# Altium footprint library Connector_PinHeader_1.00mm.PcbLib: 278 footprints (part 2 of 18)
Each footprint in its own frame and in the unit in brackets; x right, y up, seen from the top. Pads: shape width x height; smd on the part's side, far side on the other; paste and mask are expansions set on the pad; w line width, h text height; cw(c..) or ccw(c..) is an arc to the next point about the centre after c.
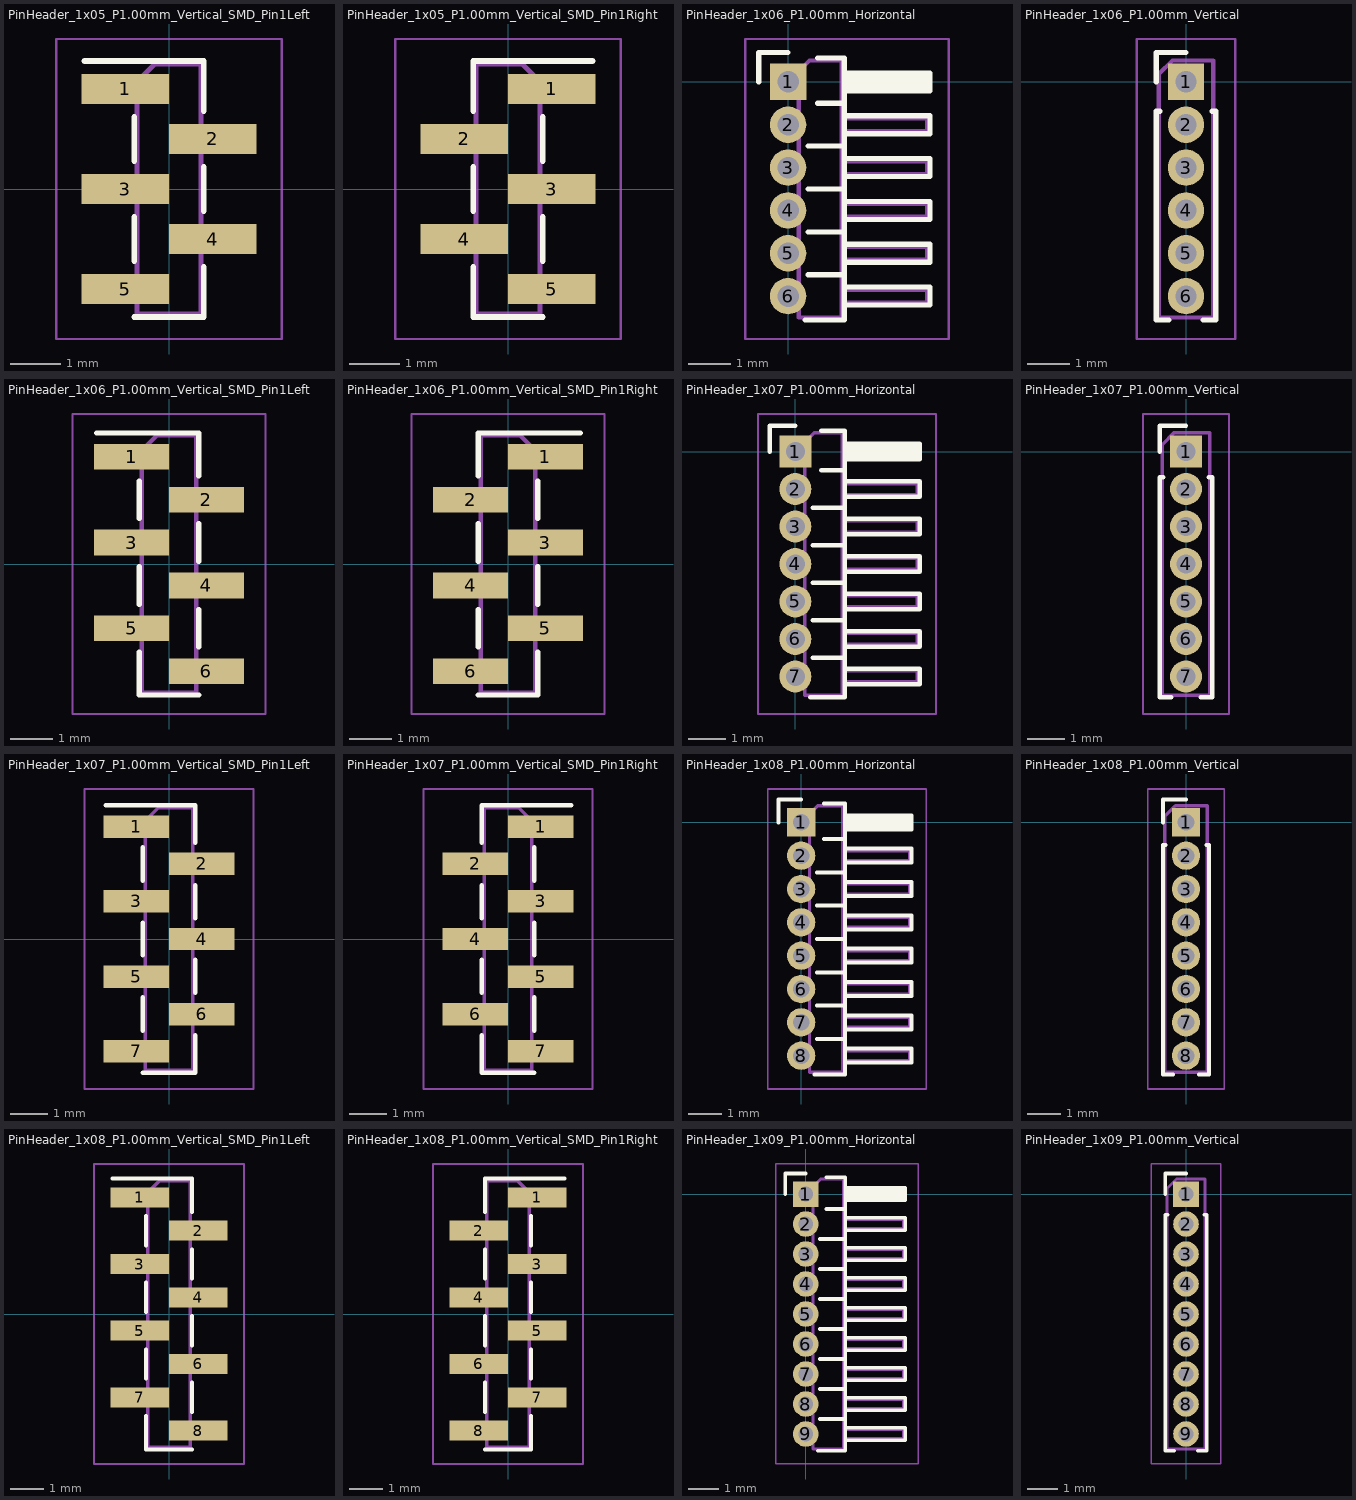
[diagram p1: the footprints below, top view; thin cyan lines are the x and y axes]

## PinHeader_1x05_P1.00mm_Vertical_SMD_Pin1Left [mm]
pads (5):
  rect 1.75x0.6 smd: 1(-0.875,2) 2(0.875,1) 3(-0.875,0) 4(0.875,-1) 5(-0.875,-2)
F.SilkS:
  lines w0.12: -1.69,2.56 -0.695,2.56 0.695,2.56 0.695,1.56 ; -0.695,-2.56 0.695,-2.56 0.695,-1.56 ; -0.695,-1.44 -0.695,-0.56 ; -0.695,0.56 -0.695,1.44 ; 0.695,-0.44 0.695,0.44
F.CrtYd:
  lines w0.05: -2.25,-3 2.25,-3 2.25,3 -2.25,3 -2.25,-3
F.Fab:
  lines w0.1: -0.635,-2.15 -1.25,-2.15 -1.25,-1.85 -0.635,-1.85 ; -0.635,-0.15 -1.25,-0.15 -1.25,0.15 -0.635,0.15 ; -0.635,1.85 -1.25,1.85 -1.25,2.15 -0.635,2.15 ; 0.635,-1.15 1.25,-1.15 1.25,-0.85 0.635,-0.85 ; 0.635,0.85 1.25,0.85 1.25,1.15 0.635,1.15 ; -0.635,2.15 -0.285,2.5 0.635,2.5 0.635,-2.5 -0.635,-2.5 -0.635,2.15
  text "'.Designator'" at 0.84,-4.047 h1

## PinHeader_1x05_P1.00mm_Vertical_SMD_Pin1Right [mm]
pads (5):
  rect 1.75x0.6 smd: 1(0.875,2) 2(-0.875,1) 3(0.875,0) 4(-0.875,-1) 5(0.875,-2)
F.SilkS:
  lines w0.12: -0.695,-1.56 -0.695,-2.56 0.695,-2.56 ; -0.695,-0.44 -0.695,0.44 ; -0.695,2.44 -0.695,1.56 -0.695,2.56 0.695,2.56 1.69,2.56 ; 0.695,-1.44 0.695,-0.56 ; 0.695,0.56 0.695,1.44
F.CrtYd:
  lines w0.05: -2.25,-3 2.25,-3 2.25,3 -2.25,3 -2.25,-3
F.Fab:
  lines w0.1: -0.635,-1.15 -1.25,-1.15 -1.25,-0.85 -0.635,-0.85 ; -0.635,0.85 -1.25,0.85 -1.25,1.15 -0.635,1.15 ; 0.635,-2.15 1.25,-2.15 1.25,-1.85 0.635,-1.85 ; 0.635,-0.15 1.25,-0.15 1.25,0.15 0.635,0.15 ; 0.635,1.85 1.25,1.85 1.25,2.15 0.635,2.15 ; 0.635,2.15 0.635,-2.5 -0.635,-2.5 -0.635,2.5 0.285,2.5 0.635,2.15
  text "'.Designator'" at 0.84,-4.047 h1

## PinHeader_1x06_P1.00mm_Horizontal [mm]
pads (6):
  rect 0.85x0.85 hole 0.5: 1(0,0)
  rrect100% 0.85x0.85 hole 0.5: 2(0,-1) 3(0,-2) 4(0,-3) 5(0,-4) 6(0,-5)
F.SilkS:
  lines w0.12: -0.685,0 -0.685,0.685 0,0.685 ; 0.394,-5.56 1.31,-5.56 1.31,0.56 0.685,0.56 ; 0.468,-4.5 1.31,-4.5 ; 0.468,-3.5 1.31,-3.5 ; 0.468,-2.5 1.31,-2.5 ; 0.468,-1.5 1.31,-1.5 ; 0.685,-0.5 1.31,-0.5 ; 1.31,-5.21 3.31,-5.21 3.31,-4.79 1.31,-4.79 ; 1.31,-4.21 3.31,-4.21 3.31,-3.79 1.31,-3.79 ; 1.31,-3.21 3.31,-3.21 3.31,-2.79 1.31,-2.79 ; 1.31,-2.21 3.31,-2.21 3.31,-1.79 1.31,-1.79 ; 1.31,-1.21 3.31,-1.21 3.31,-0.79 1.31,-0.79 ; 1.31,-0.21 3.31,-0.21 3.31,0.21 1.31,0.21 ; 1.31,-0.09 3.31,-0.09 ; 1.31,0.03 3.31,0.03 ; 1.31,0.15 3.31,0.15
F.CrtYd:
  lines w0.05: -1,-6 -1,1 3.75,1 3.75,-6 -1,-6
F.Fab:
  lines w0.1: 0.25,-5.15 -0.15,-5.15 -0.15,-4.85 0.25,-4.85 ; 0.25,-4.15 -0.15,-4.15 -0.15,-3.85 0.25,-3.85 ; 0.25,-3.15 -0.15,-3.15 -0.15,-2.85 0.25,-2.85 ; 0.25,-2.15 -0.15,-2.15 -0.15,-1.85 0.25,-1.85 ; 0.25,-1.15 -0.15,-1.15 -0.15,-0.85 0.25,-0.85 ; 0.25,-0.15 -0.15,-0.15 -0.15,0.15 0.25,0.15 ; 1.25,-5.15 3.25,-5.15 3.25,-4.85 1.25,-4.85 ; 1.25,-4.15 3.25,-4.15 3.25,-3.85 1.25,-3.85 ; 1.25,-3.15 3.25,-3.15 3.25,-2.85 1.25,-2.85 ; 1.25,-2.15 3.25,-2.15 3.25,-1.85 1.25,-1.85 ; 1.25,-1.15 3.25,-1.15 3.25,-0.85 1.25,-0.85 ; 1.25,-0.15 3.25,-0.15 3.25,0.15 1.25,0.15 ; 0.25,-5.5 1.25,-5.5 1.25,0.5 0.5,0.5 0.25,0.25 0.25,-5.5
  text "'.Designator'" at 1.254,-4.928 h0.6

## PinHeader_1x06_P1.00mm_Vertical [mm]
pads (6):
  rect 0.85x0.85 hole 0.5: 1(0,0)
  rrect100% 0.85x0.85 hole 0.5: 2(0,-1) 3(0,-2) 4(0,-3) 5(0,-4) 6(0,-5)
F.SilkS:
  lines w0.12: -0.695,0 -0.695,0.685 0,0.685 ; -0.608,-0.685 -0.695,-0.685 -0.695,-5.56 -0.394,-5.56 ; 0.394,-5.56 0.695,-5.56 0.695,-0.685 0.608,-0.685
F.CrtYd:
  lines w0.05: -1.15,-6 -1.15,1 1.15,1 1.15,-6 -1.15,-6
F.Fab:
  lines w0.1: -0.635,-5.5 0.635,-5.5 0.635,0.5 -0.318,0.5 -0.635,0.182 -0.635,-5.5
  text "'.Designator'" at 0.639,-5.576 h0.76

## PinHeader_1x06_P1.00mm_Vertical_SMD_Pin1Left [mm]
pads (6):
  rect 1.75x0.6 smd: 1(-0.875,2.5) 2(0.875,1.5) 3(-0.875,0.5) 4(0.875,-0.5) 5(-0.875,-1.5) 6(0.875,-2.5)
F.SilkS:
  lines w0.12: -1.69,3.06 -0.695,3.06 0.695,3.06 0.695,2.06 ; -0.695,-2.06 -0.695,-3.06 0.695,-3.06 ; -0.695,-0.94 -0.695,-0.06 ; -0.695,1.06 -0.695,1.94 ; 0.695,-1.94 0.695,-1.06 ; 0.695,0.06 0.695,0.94
F.CrtYd:
  lines w0.05: -2.25,-3.5 2.25,-3.5 2.25,3.5 -2.25,3.5 -2.25,-3.5
F.Fab:
  lines w0.1: -0.635,-1.65 -1.25,-1.65 -1.25,-1.35 -0.635,-1.35 ; -0.635,0.35 -1.25,0.35 -1.25,0.65 -0.635,0.65 ; -0.635,2.35 -1.25,2.35 -1.25,2.65 -0.635,2.65 ; 0.635,-2.65 1.25,-2.65 1.25,-2.35 0.635,-2.35 ; 0.635,-0.65 1.25,-0.65 1.25,-0.35 0.635,-0.35 ; 0.635,1.35 1.25,1.35 1.25,1.65 0.635,1.65 ; -0.635,2.65 -0.635,-3 0.635,-3 0.635,3 -0.285,3 -0.635,2.65
  text "'.Designator'" at 0.84,-4.047 h1

## PinHeader_1x06_P1.00mm_Vertical_SMD_Pin1Right [mm]
pads (6):
  rect 1.75x0.6 smd: 1(0.875,2.5) 2(-0.875,1.5) 3(0.875,0.5) 4(-0.875,-0.5) 5(0.875,-1.5) 6(-0.875,-2.5)
F.SilkS:
  lines w0.12: -0.695,-3.06 0.695,-3.06 0.695,-2.06 ; -0.695,-1.94 -0.695,-1.06 ; -0.695,0.06 -0.695,0.94 ; -0.695,2.94 -0.695,2.06 -0.695,3.06 0.695,3.06 1.69,3.06 ; 0.695,-0.94 0.695,-0.06 ; 0.695,1.06 0.695,1.94
F.CrtYd:
  lines w0.05: -2.25,-3.5 -2.25,3.5 2.25,3.5 2.25,-3.5 -2.25,-3.5
F.Fab:
  lines w0.1: -0.635,-2.65 -1.25,-2.65 -1.25,-2.35 -0.635,-2.35 ; -0.635,-0.65 -1.25,-0.65 -1.25,-0.35 -0.635,-0.35 ; -0.635,1.35 -1.25,1.35 -1.25,1.65 -0.635,1.65 ; 0.635,-1.65 1.25,-1.65 1.25,-1.35 0.635,-1.35 ; 0.635,0.35 1.25,0.35 1.25,0.65 0.635,0.65 ; 0.635,2.35 1.25,2.35 1.25,2.65 0.635,2.65 ; 0.635,2.65 0.635,-3 -0.635,-3 -0.635,3 0.285,3 0.635,2.65
  text "'.Designator'" at 0.84,-4.047 h1

## PinHeader_1x07_P1.00mm_Horizontal [mm]
pads (7):
  rect 0.85x0.85 hole 0.5: 1(0,0)
  rrect100% 0.85x0.85 hole 0.5: 2(0,-1) 3(0,-2) 4(0,-3) 5(0,-4) 6(0,-5) 7(0,-6)
F.SilkS:
  lines w0.12: -0.685,0 -0.685,0.685 0,0.685 ; 0.394,-6.56 1.31,-6.56 1.31,0.56 0.685,0.56 ; 0.468,-5.5 1.31,-5.5 ; 0.468,-4.5 1.31,-4.5 ; 0.468,-3.5 1.31,-3.5 ; 0.468,-2.5 1.31,-2.5 ; 0.468,-1.5 1.31,-1.5 ; 0.685,-0.5 1.31,-0.5 ; 1.31,-6.21 3.31,-6.21 3.31,-5.79 1.31,-5.79 ; 1.31,-5.21 3.31,-5.21 3.31,-4.79 1.31,-4.79 ; 1.31,-4.21 3.31,-4.21 3.31,-3.79 1.31,-3.79 ; 1.31,-3.21 3.31,-3.21 3.31,-2.79 1.31,-2.79 ; 1.31,-2.21 3.31,-2.21 3.31,-1.79 1.31,-1.79 ; 1.31,-1.21 3.31,-1.21 3.31,-0.79 1.31,-0.79 ; 1.31,-0.21 3.31,-0.21 3.31,0.21 1.31,0.21 ; 1.31,-0.09 3.31,-0.09 ; 1.31,0.03 3.31,0.03 ; 1.31,0.15 3.31,0.15
F.CrtYd:
  lines w0.05: -1,-7 -1,1 3.75,1 3.75,-7 -1,-7
F.Fab:
  lines w0.1: 0.25,-6.15 -0.15,-6.15 -0.15,-5.85 0.25,-5.85 ; 0.25,-5.15 -0.15,-5.15 -0.15,-4.85 0.25,-4.85 ; 0.25,-4.15 -0.15,-4.15 -0.15,-3.85 0.25,-3.85 ; 0.25,-3.15 -0.15,-3.15 -0.15,-2.85 0.25,-2.85 ; 0.25,-2.15 -0.15,-2.15 -0.15,-1.85 0.25,-1.85 ; 0.25,-1.15 -0.15,-1.15 -0.15,-0.85 0.25,-0.85 ; 0.25,-0.15 -0.15,-0.15 -0.15,0.15 0.25,0.15 ; 1.25,-6.15 3.25,-6.15 3.25,-5.85 1.25,-5.85 ; 1.25,-5.15 3.25,-5.15 3.25,-4.85 1.25,-4.85 ; 1.25,-4.15 3.25,-4.15 3.25,-3.85 1.25,-3.85 ; 1.25,-3.15 3.25,-3.15 3.25,-2.85 1.25,-2.85 ; 1.25,-2.15 3.25,-2.15 3.25,-1.85 1.25,-1.85 ; 1.25,-1.15 3.25,-1.15 3.25,-0.85 1.25,-0.85 ; 1.25,-0.15 3.25,-0.15 3.25,0.15 1.25,0.15 ; 0.25,-6.5 1.25,-6.5 1.25,0.5 0.5,0.5 0.25,0.25 0.25,-6.5
  text "'.Designator'" at 1.254,-5.428 h0.6

## PinHeader_1x07_P1.00mm_Vertical [mm]
pads (7):
  rect 0.85x0.85 hole 0.5: 1(0,0)
  rrect100% 0.85x0.85 hole 0.5: 2(0,-1) 3(0,-2) 4(0,-3) 5(0,-4) 6(0,-5) 7(0,-6)
F.SilkS:
  lines w0.12: -0.695,0 -0.695,0.685 0,0.685 ; -0.608,-0.685 -0.695,-0.685 -0.695,-6.56 -0.394,-6.56 ; 0.394,-6.56 0.695,-6.56 0.695,-0.685 0.608,-0.685
F.CrtYd:
  lines w0.05: -1.15,-7 -1.15,1 1.15,1 1.15,-7 -1.15,-7
F.Fab:
  lines w0.1: -0.635,-6.5 -0.635,0.182 -0.318,0.5 0.635,0.5 0.635,-6.5 -0.635,-6.5
  text "'.Designator'" at 0.639,-6.076 h0.76

## PinHeader_1x07_P1.00mm_Vertical_SMD_Pin1Left [mm]
pads (7):
  rect 1.75x0.6 smd: 1(-0.875,3) 2(0.875,2) 3(-0.875,1) 4(0.875,0) 5(-0.875,-1) 6(0.875,-2) 7(-0.875,-3)
F.SilkS:
  lines w0.12: -1.69,3.56 -0.695,3.56 0.695,3.56 0.695,2.56 ; -0.695,-3.56 0.695,-3.56 0.695,-2.56 ; -0.695,-2.44 -0.695,-1.56 ; -0.695,-0.44 -0.695,0.44 ; -0.695,1.56 -0.695,2.44 ; 0.695,-1.44 0.695,-0.56 ; 0.695,0.56 0.695,1.44
F.CrtYd:
  lines w0.05: -2.25,-4 2.25,-4 2.25,4 -2.25,4 -2.25,-4
F.Fab:
  lines w0.1: -0.635,-3.15 -1.25,-3.15 -1.25,-2.85 -0.635,-2.85 ; -0.635,-1.15 -1.25,-1.15 -1.25,-0.85 -0.635,-0.85 ; -0.635,0.85 -1.25,0.85 -1.25,1.15 -0.635,1.15 ; -0.635,2.85 -1.25,2.85 -1.25,3.15 -0.635,3.15 ; 0.635,-2.15 1.25,-2.15 1.25,-1.85 0.635,-1.85 ; 0.635,-0.15 1.25,-0.15 1.25,0.15 0.635,0.15 ; 0.635,1.85 1.25,1.85 1.25,2.15 0.635,2.15 ; -0.635,3.15 -0.635,-3.5 0.635,-3.5 0.635,3.5 -0.285,3.5 -0.635,3.15
  text "'.Designator'" at 0.84,-4.047 h1

## PinHeader_1x07_P1.00mm_Vertical_SMD_Pin1Right [mm]
pads (7):
  rect 1.75x0.6 smd: 1(0.875,3) 2(-0.875,2) 3(0.875,1) 4(-0.875,0) 5(0.875,-1) 6(-0.875,-2) 7(0.875,-3)
F.SilkS:
  lines w0.12: -0.695,-2.56 -0.695,-3.56 0.695,-3.56 ; -0.695,-1.44 -0.695,-0.56 ; -0.695,0.56 -0.695,1.44 ; -0.695,3.44 -0.695,2.56 -0.695,3.56 0.695,3.56 1.69,3.56 ; 0.695,-2.44 0.695,-1.56 ; 0.695,-0.44 0.695,0.44 ; 0.695,1.56 0.695,2.44
F.CrtYd:
  lines w0.05: -2.25,-4 2.25,-4 2.25,4 -2.25,4 -2.25,-4
F.Fab:
  lines w0.1: -0.635,-2.15 -1.25,-2.15 -1.25,-1.85 -0.635,-1.85 ; -0.635,-0.15 -1.25,-0.15 -1.25,0.15 -0.635,0.15 ; -0.635,1.85 -1.25,1.85 -1.25,2.15 -0.635,2.15 ; 0.635,-3.15 1.25,-3.15 1.25,-2.85 0.635,-2.85 ; 0.635,-1.15 1.25,-1.15 1.25,-0.85 0.635,-0.85 ; 0.635,0.85 1.25,0.85 1.25,1.15 0.635,1.15 ; 0.635,2.85 1.25,2.85 1.25,3.15 0.635,3.15 ; 0.635,3.15 0.285,3.5 -0.635,3.5 -0.635,-3.5 0.635,-3.5 0.635,3.15
  text "'.Designator'" at 0.84,-4.047 h1

## PinHeader_1x08_P1.00mm_Horizontal [mm]
pads (8):
  rect 0.85x0.85 hole 0.5: 1(0,0)
  rrect100% 0.85x0.85 hole 0.5: 2(0,-1) 3(0,-2) 4(0,-3) 5(0,-4) 6(0,-5) 7(0,-6) 8(0,-7)
F.SilkS:
  lines w0.12: -0.685,0 -0.685,0.685 0,0.685 ; 0.394,-7.56 1.31,-7.56 1.31,0.56 0.685,0.56 ; 0.468,-6.5 1.31,-6.5 ; 0.468,-5.5 1.31,-5.5 ; 0.468,-4.5 1.31,-4.5 ; 0.468,-3.5 1.31,-3.5 ; 0.468,-2.5 1.31,-2.5 ; 0.468,-1.5 1.31,-1.5 ; 0.685,-0.5 1.31,-0.5 ; 1.31,-7.21 3.31,-7.21 3.31,-6.79 1.31,-6.79 ; 1.31,-6.21 3.31,-6.21 3.31,-5.79 1.31,-5.79 ; 1.31,-5.21 3.31,-5.21 3.31,-4.79 1.31,-4.79 ; 1.31,-4.21 3.31,-4.21 3.31,-3.79 1.31,-3.79 ; 1.31,-3.21 3.31,-3.21 3.31,-2.79 1.31,-2.79 ; 1.31,-2.21 3.31,-2.21 3.31,-1.79 1.31,-1.79 ; 1.31,-1.21 3.31,-1.21 3.31,-0.79 1.31,-0.79 ; 1.31,-0.21 3.31,-0.21 3.31,0.21 1.31,0.21 ; 1.31,-0.09 3.31,-0.09 ; 1.31,0.03 3.31,0.03 ; 1.31,0.15 3.31,0.15
F.CrtYd:
  lines w0.05: -1,-8 3.75,-8 3.75,1 -1,1 -1,-8
F.Fab:
  lines w0.1: 0.25,-7.15 -0.15,-7.15 -0.15,-6.85 0.25,-6.85 ; 0.25,-6.15 -0.15,-6.15 -0.15,-5.85 0.25,-5.85 ; 0.25,-5.15 -0.15,-5.15 -0.15,-4.85 0.25,-4.85 ; 0.25,-4.15 -0.15,-4.15 -0.15,-3.85 0.25,-3.85 ; 0.25,-3.15 -0.15,-3.15 -0.15,-2.85 0.25,-2.85 ; 0.25,-2.15 -0.15,-2.15 -0.15,-1.85 0.25,-1.85 ; 0.25,-1.15 -0.15,-1.15 -0.15,-0.85 0.25,-0.85 ; 0.25,-0.15 -0.15,-0.15 -0.15,0.15 0.25,0.15 ; 1.25,-7.15 3.25,-7.15 3.25,-6.85 1.25,-6.85 ; 1.25,-6.15 3.25,-6.15 3.25,-5.85 1.25,-5.85 ; 1.25,-5.15 3.25,-5.15 3.25,-4.85 1.25,-4.85 ; 1.25,-4.15 3.25,-4.15 3.25,-3.85 1.25,-3.85 ; 1.25,-3.15 3.25,-3.15 3.25,-2.85 1.25,-2.85 ; 1.25,-2.15 3.25,-2.15 3.25,-1.85 1.25,-1.85 ; 1.25,-1.15 3.25,-1.15 3.25,-0.85 1.25,-0.85 ; 1.25,-0.15 3.25,-0.15 3.25,0.15 1.25,0.15 ; 0.25,-7.5 0.25,0.25 0.5,0.5 1.25,0.5 1.25,-7.5 0.25,-7.5
  text "'.Designator'" at 1.254,-5.928 h0.6

## PinHeader_1x08_P1.00mm_Vertical [mm]
pads (8):
  rect 0.85x0.85 hole 0.5: 1(0,0)
  rrect100% 0.85x0.85 hole 0.5: 2(0,-1) 3(0,-2) 4(0,-3) 5(0,-4) 6(0,-5) 7(0,-6) 8(0,-7)
F.SilkS:
  lines w0.12: -0.695,0 -0.695,0.685 0,0.685 ; -0.608,-0.685 -0.695,-0.685 -0.695,-7.56 -0.394,-7.56 ; 0.394,-7.56 0.695,-7.56 0.695,-0.685 0.608,-0.685
F.CrtYd:
  lines w0.05: -1.15,-8 1.15,-8 1.15,1 -1.15,1 -1.15,-8
F.Fab:
  lines w0.1: -0.635,-7.5 0.635,-7.5 0.635,0.5 -0.318,0.5 -0.635,0.182 -0.635,-7.5
  text "'.Designator'" at 0.639,-6.576 h0.76

## PinHeader_1x08_P1.00mm_Vertical_SMD_Pin1Left [mm]
pads (8):
  rect 1.75x0.6 smd: 1(-0.875,3.5) 2(0.875,2.5) 3(-0.875,1.5) 4(0.875,0.5) 5(-0.875,-0.5) 6(0.875,-1.5) 7(-0.875,-2.5) 8(0.875,-3.5)
F.SilkS:
  lines w0.12: -1.69,4.06 -0.695,4.06 0.695,4.06 0.695,3.06 ; -0.695,-3.06 -0.695,-4.06 0.695,-4.06 ; -0.695,-1.94 -0.695,-1.06 ; -0.695,0.06 -0.695,0.94 ; -0.695,2.06 -0.695,2.94 ; 0.695,-2.94 0.695,-2.06 ; 0.695,-0.94 0.695,-0.06 ; 0.695,1.06 0.695,1.94
F.CrtYd:
  lines w0.05: -2.25,-4.5 -2.25,4.5 2.25,4.5 2.25,-4.5 -2.25,-4.5
F.Fab:
  lines w0.1: -0.635,-2.65 -1.25,-2.65 -1.25,-2.35 -0.635,-2.35 ; -0.635,-0.65 -1.25,-0.65 -1.25,-0.35 -0.635,-0.35 ; -0.635,1.35 -1.25,1.35 -1.25,1.65 -0.635,1.65 ; -0.635,3.35 -1.25,3.35 -1.25,3.65 -0.635,3.65 ; 0.635,-3.65 1.25,-3.65 1.25,-3.35 0.635,-3.35 ; 0.635,-1.65 1.25,-1.65 1.25,-1.35 0.635,-1.35 ; 0.635,0.35 1.25,0.35 1.25,0.65 0.635,0.65 ; 0.635,2.35 1.25,2.35 1.25,2.65 0.635,2.65 ; -0.635,3.65 -0.285,4 0.635,4 0.635,-4 -0.635,-4 -0.635,3.65
  text "'.Designator'" at 0.84,-4.047 h1

## PinHeader_1x08_P1.00mm_Vertical_SMD_Pin1Right [mm]
pads (8):
  rect 1.75x0.6 smd: 1(0.875,3.5) 2(-0.875,2.5) 3(0.875,1.5) 4(-0.875,0.5) 5(0.875,-0.5) 6(-0.875,-1.5) 7(0.875,-2.5) 8(-0.875,-3.5)
F.SilkS:
  lines w0.12: -0.695,-4.06 0.695,-4.06 0.695,-3.06 ; -0.695,-2.94 -0.695,-2.06 ; -0.695,-0.94 -0.695,-0.06 ; -0.695,1.06 -0.695,1.94 ; -0.695,3.94 -0.695,3.06 -0.695,4.06 0.695,4.06 1.69,4.06 ; 0.695,-1.94 0.695,-1.06 ; 0.695,0.06 0.695,0.94 ; 0.695,2.06 0.695,2.94
F.CrtYd:
  lines w0.05: -2.25,-4.5 2.25,-4.5 2.25,4.5 -2.25,4.5 -2.25,-4.5
F.Fab:
  lines w0.1: -0.635,-3.65 -1.25,-3.65 -1.25,-3.35 -0.635,-3.35 ; -0.635,-1.65 -1.25,-1.65 -1.25,-1.35 -0.635,-1.35 ; -0.635,0.35 -1.25,0.35 -1.25,0.65 -0.635,0.65 ; -0.635,2.35 -1.25,2.35 -1.25,2.65 -0.635,2.65 ; 0.635,-2.65 1.25,-2.65 1.25,-2.35 0.635,-2.35 ; 0.635,-0.65 1.25,-0.65 1.25,-0.35 0.635,-0.35 ; 0.635,1.35 1.25,1.35 1.25,1.65 0.635,1.65 ; 0.635,3.35 1.25,3.35 1.25,3.65 0.635,3.65 ; 0.635,3.65 0.635,-4 -0.635,-4 -0.635,4 0.285,4 0.635,3.65
  text "'.Designator'" at 0.84,-4.047 h1

## PinHeader_1x09_P1.00mm_Horizontal [mm]
pads (9):
  rect 0.85x0.85 hole 0.5: 1(0,0)
  rrect100% 0.85x0.85 hole 0.5: 2(0,-1) 3(0,-2) 4(0,-3) 5(0,-4) 6(0,-5) 7(0,-6) 8(0,-7) 9(0,-8)
F.SilkS:
  lines w0.12: -0.685,0 -0.685,0.685 0,0.685 ; 0.394,-8.56 1.31,-8.56 1.31,0.56 0.685,0.56 ; 0.468,-7.5 1.31,-7.5 ; 0.468,-6.5 1.31,-6.5 ; 0.468,-5.5 1.31,-5.5 ; 0.468,-4.5 1.31,-4.5 ; 0.468,-3.5 1.31,-3.5 ; 0.468,-2.5 1.31,-2.5 ; 0.468,-1.5 1.31,-1.5 ; 0.685,-0.5 1.31,-0.5 ; 1.31,-8.21 3.31,-8.21 3.31,-7.79 1.31,-7.79 ; 1.31,-7.21 3.31,-7.21 3.31,-6.79 1.31,-6.79 ; 1.31,-6.21 3.31,-6.21 3.31,-5.79 1.31,-5.79 ; 1.31,-5.21 3.31,-5.21 3.31,-4.79 1.31,-4.79 ; 1.31,-4.21 3.31,-4.21 3.31,-3.79 1.31,-3.79 ; 1.31,-3.21 3.31,-3.21 3.31,-2.79 1.31,-2.79 ; 1.31,-2.21 3.31,-2.21 3.31,-1.79 1.31,-1.79 ; 1.31,-1.21 3.31,-1.21 3.31,-0.79 1.31,-0.79 ; 1.31,-0.21 3.31,-0.21 3.31,0.21 1.31,0.21 ; 1.31,-0.09 3.31,-0.09 ; 1.31,0.03 3.31,0.03 ; 1.31,0.15 3.31,0.15
F.CrtYd:
  lines w0.05: -1,-9 -1,1 3.75,1 3.75,-9 -1,-9
F.Fab:
  lines w0.1: 0.25,-8.15 -0.15,-8.15 -0.15,-7.85 0.25,-7.85 ; 0.25,-7.15 -0.15,-7.15 -0.15,-6.85 0.25,-6.85 ; 0.25,-6.15 -0.15,-6.15 -0.15,-5.85 0.25,-5.85 ; 0.25,-5.15 -0.15,-5.15 -0.15,-4.85 0.25,-4.85 ; 0.25,-4.15 -0.15,-4.15 -0.15,-3.85 0.25,-3.85 ; 0.25,-3.15 -0.15,-3.15 -0.15,-2.85 0.25,-2.85 ; 0.25,-2.15 -0.15,-2.15 -0.15,-1.85 0.25,-1.85 ; 0.25,-1.15 -0.15,-1.15 -0.15,-0.85 0.25,-0.85 ; 0.25,-0.15 -0.15,-0.15 -0.15,0.15 0.25,0.15 ; 1.25,-8.15 3.25,-8.15 3.25,-7.85 1.25,-7.85 ; 1.25,-7.15 3.25,-7.15 3.25,-6.85 1.25,-6.85 ; 1.25,-6.15 3.25,-6.15 3.25,-5.85 1.25,-5.85 ; 1.25,-5.15 3.25,-5.15 3.25,-4.85 1.25,-4.85 ; 1.25,-4.15 3.25,-4.15 3.25,-3.85 1.25,-3.85 ; 1.25,-3.15 3.25,-3.15 3.25,-2.85 1.25,-2.85 ; 1.25,-2.15 3.25,-2.15 3.25,-1.85 1.25,-1.85 ; 1.25,-1.15 3.25,-1.15 3.25,-0.85 1.25,-0.85 ; 1.25,-0.15 3.25,-0.15 3.25,0.15 1.25,0.15 ; 0.25,-8.5 0.25,0.25 0.5,0.5 1.25,0.5 1.25,-8.5 0.25,-8.5
  text "'.Designator'" at 1.254,-6.428 h0.6

## PinHeader_1x09_P1.00mm_Vertical [mm]
pads (9):
  rect 0.85x0.85 hole 0.5: 1(0,0)
  rrect100% 0.85x0.85 hole 0.5: 2(0,-1) 3(0,-2) 4(0,-3) 5(0,-4) 6(0,-5) 7(0,-6) 8(0,-7) 9(0,-8)
F.SilkS:
  lines w0.12: -0.695,0 -0.695,0.685 0,0.685 ; -0.608,-0.685 -0.695,-0.685 -0.695,-8.56 -0.394,-8.56 ; 0.394,-8.56 0.695,-8.56 0.695,-0.685 0.608,-0.685
F.CrtYd:
  lines w0.05: -1.15,-9 -1.15,1 1.15,1 1.15,-9 -1.15,-9
F.Fab:
  lines w0.1: -0.635,-8.5 -0.635,0.182 -0.318,0.5 0.635,0.5 0.635,-8.5 -0.635,-8.5
  text "'.Designator'" at 0.639,-7.076 h0.76